# Altium footprint library L3.PcbLib: 47 footprints (part 1 of 3)
Each footprint in its own frame and in the unit in brackets; x right, y up, seen from the top. Pads: shape width x height; smd on the part's side, far side on the other; paste and mask are expansions set on the pad; w line width, h text height; cw(c..) or ccw(c..) is an arc to the next point about the centre after c.
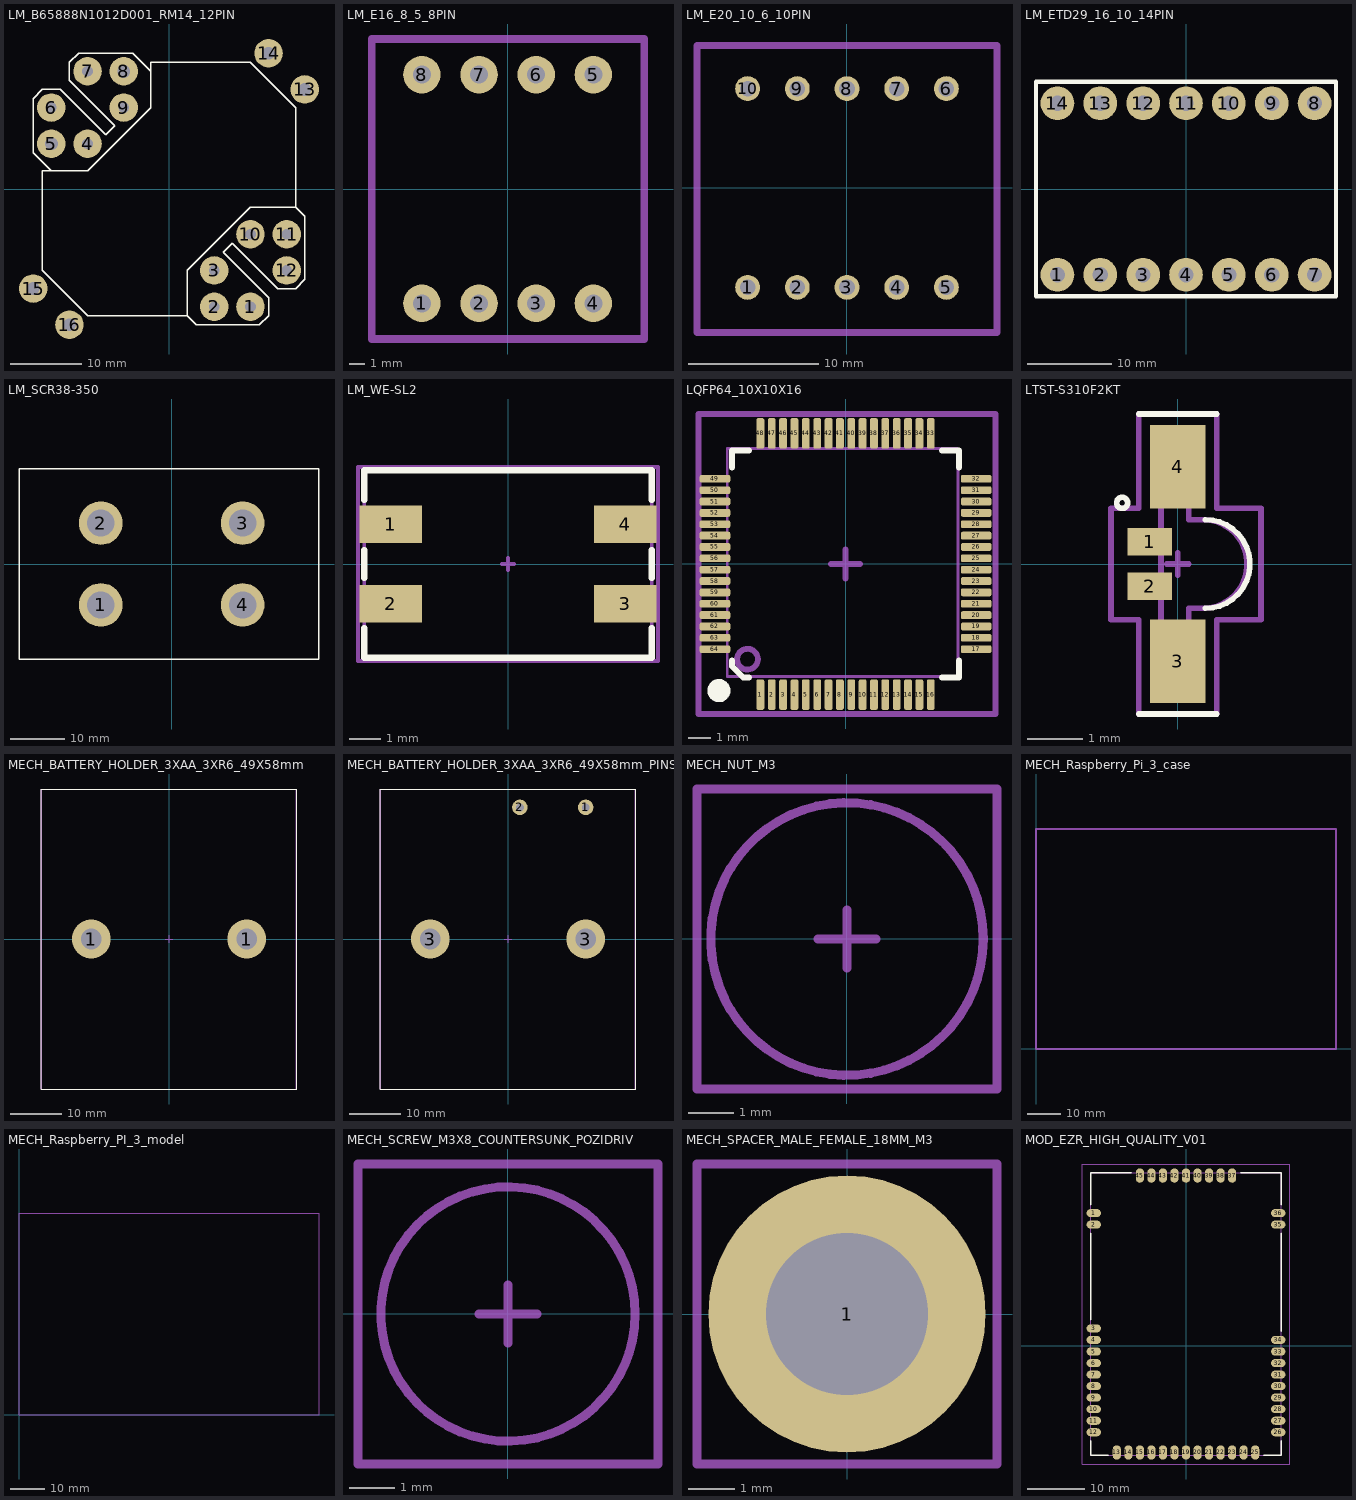
[diagram p0: the footprints below, top view; thin cyan lines are the x and y axes]

## LM_B65888N1012D001_RM14_12PIN [mm]
pads (16):
  round 4 hole 1.5: 1(11.43,-16.51) 2(6.35,-16.51) 3(6.35,-11.43) 4(-11.43,6.35) 6(-16.51,11.43) 7(-11.43,16.51) 9(-6.35,11.43) 10(11.43,-6.35) 11(16.51,-6.35) 12(16.51,-11.43)
  round 4 hole 1.8: 5(-16.51,6.35) 8(-6.35,16.51) 13(19.05,13.97) 14(13.97,19.05) 15(-19.05,-13.97) 16(-13.97,-19.05)
Top Overlay:
  lines w0.2: -16.51,2.54 -19.05,5.08 -19.05,10.16 -19.05,12.7 -17.78,13.97 -15.24,13.97 -10.16,8.89 -8.89,7.62 -7.62,8.89 -13.97,15.24 -13.97,17.78 -12.7,19.05 -10.16,19.05 -5.08,19.05 -2.54,16.51 ; 2.54,-17.78 3.81,-19.05 11.43,-19.05 12.7,-19.05 13.97,-17.78 13.97,-15.24 7.62,-8.89 8.89,-7.62 15.24,-13.97 17.78,-13.97 19.05,-12.7 19.05,-3.81 17.78,-2.54 ; 2.54,-17.78 2.54,-11.43 11.43,-2.54 17.78,-2.54 ; 2.54,-17.78 -11.43,-17.78 -17.78,-11.43 -17.78,2.54 -11.43,2.54 -2.54,11.43 -2.54,17.78 11.43,17.78 17.78,11.43 17.78,-2.54
3D body "RM-14_12pin.stp": height 30.25, standoff -2.75, extent -19.586,-19.586 19.586,19.586

## LM_E16_8_5_8PIN [mm]
pads (8):
  round 2.5 hole 1.2: 1(-5.715,-7.62) 2(-1.905,-7.62) 3(1.905,-7.62) 4(5.715,-7.62) 5(5.715,7.62) 6(1.905,7.62) 7(-1.905,7.62) 8(-5.715,7.62)
Mechanical 1:
  lines w0.508: -9.056,-10 9.106,-10 9.106,10 -9.056,10 -9.056,-10
3D body "User Library-Ensamblaje trafo 16-8-5.STEP": height 13.89, standoff -2.81, extent -9.056,-10 9.106,10

## LM_E20_10_6_10PIN [mm]
pads (10):
  round 1.905 hole 1.2: 1(-7.62,-7.62) 2(-3.81,-7.62) 3(0,-7.62) 4(3.81,-7.62) 5(7.62,-7.62) 6(7.62,7.62) 7(3.81,7.62) 8(0,7.62) 9(-3.81,7.62) 10(-7.62,7.62)
Mechanical 1:
  lines w0.508: -11.5,-11.078 11.5,-11.078 11.5,10.922 -11.5,10.922 -11.5,-11.078
3D body "e20.STEP": height 17.53, standoff -3.51, extent -11.5,-11.078 11.5,10.922

## LM_ETD29_16_10_14PIN [mm]
pads (14):
  round 4 hole 1.8: 1(-15.24,-10.16) 2(-10.16,-10.16) 3(-5.08,-10.16) 4(0,-10.16) 5(5.08,-10.16) 6(10.16,-10.16) 7(15.24,-10.16) 8(15.24,10.16) 9(10.16,10.16) 10(5.08,10.16) 11(0,10.16) 12(-5.08,10.16) 13(-10.16,10.16) 14(-15.24,10.16)
Top Overlay:
  lines w0.508: -17.78,-12.7 17.78,-12.7 17.78,12.7 -17.78,12.7 -17.78,-12.7
3D body "ETD29-K-V-14P.STEP": height 36.4, standoff -6.8, extent -17.5,-11.773 17.5,12.027

## LM_SCR38-350 [mm]
pads (4):
  round 8 hole 5: 1(-13,-7.5) 2(-13,7.5) 3(13,7.5) 4(13,-7.5)
Top Overlay:
  lines w0.254: -28,-17.5 27,-17.5 27,17.5 -28,17.5 -28,-17.5
3D body "choke_4pin.stp": height 52.25, standoff -3.92, extent -25.224,-21.584 25.017,21.166

## LM_WE-SL2 [mm] "SMD Inductor, 4-Leads, Body 9.2x6.0mm"
height 5
pads (4):
  rect 2x1.2 smd: 1(-3.75,1.27) 2(-3.75,-1.27) 3(3.75,-1.27) 4(3.75,1.27)
Top Overlay:
  lines w0.2: -4.6,-2.05 -4.6,-3 4.6,-3 4.6,-2.05 ; -4.6,-0.45 -4.6,0.45 ; -4.6,2.05 -4.6,3 4.6,3 4.6,2.05 ; 4.6,-0.45 4.6,0.45
Mechanical 13:
  lines w0.1: -4.6,-3 4.6,-3 4.6,3 -4.6,3 -4.6,-3
Mechanical 15:
  lines w0.127: -0.2,0 0.2,0 ; 0,-0.2 0,0.2 ; -4.8,-3.1 4.8,-3.1 4.8,3.1 -4.8,3.1 -4.8,-3.1
Mechanical 17:
  text "'.Designator'" at -4.8,-2.7 h0.51
Mechanical 19:
  text "'.Comment'" at -4.8,-2.7 h0.51
3D body "74422x.stp": height 5.05, standoff 0.05, extent -4.6,-3 4.6,3

## LQFP64_10X10X16 [mm]
pads (64):
  rrect50% 0.343x1.35 smd: 1(-3.75,-5.75) 2(-3.25,-5.75) 3(-2.75,-5.75) 4(-2.25,-5.75) 5(-1.75,-5.75) 6(-1.25,-5.75) 7(-0.75,-5.75) 8(-0.25,-5.75) 9(0.25,-5.75) 10(0.75,-5.75) 11(1.25,-5.75) 12(1.75,-5.75) 13(2.25,-5.75) 14(2.75,-5.75) 15(3.25,-5.75) 16(3.75,-5.75) 33(3.75,5.75) 34(3.25,5.75) 35(2.75,5.75) 36(2.25,5.75) 37(1.75,5.75) 38(1.25,5.75) 39(0.75,5.75) 40(0.25,5.75) 41(-0.25,5.75) 42(-0.75,5.75) 43(-1.25,5.75) 44(-1.75,5.75) 45(-2.25,5.75) 46(-2.75,5.75) 47(-3.25,5.75) 48(-3.75,5.75)
  rrect50% 1.35x0.343 smd: 17(5.75,-3.75) 18(5.75,-3.25) 19(5.75,-2.75) 20(5.75,-2.25) 21(5.75,-1.75) 22(5.75,-1.25) 23(5.75,-0.75) 24(5.75,-0.25) 25(5.75,0.25) 26(5.75,0.75) 27(5.75,1.25) 28(5.75,1.75) 29(5.75,2.25) 30(5.75,2.75) 31(5.75,3.25) 32(5.75,3.75) 49(-5.75,3.75) 50(-5.75,3.25) 51(-5.75,2.75) 52(-5.75,2.25) 53(-5.75,1.75) 54(-5.75,1.25) 55(-5.75,0.75) 56(-5.75,0.25) 57(-5.75,-0.25) 58(-5.75,-0.75) 59(-5.75,-1.25) 60(-5.75,-1.75) 61(-5.75,-2.25) 62(-5.75,-2.75) 63(-5.75,-3.25) 64(-5.75,-3.75)
Top Overlay:
  circle w0.508: c-5.575,-5.575 r0.254
  lines w0.254: -5,-4.25 -5,-4.5 -4.5,-5 -4.25,-5 ; -5,4.25 -5,5 -4.25,5 ; 4.25,-5 5,-5 5,-4.25 ; 4.25,5 5,5 5,4.25
Mechanical 2:
  circle w0.254: c-4.318,-4.191 r0.458
  lines w0.127: -5.207,-4.953 -5.207,5.08 -5.08,5.08 4.953,5.08 4.953,-4.953 -5.207,-4.953
Mechanical 4:
  lines w0.254: -0.635,0 0.635,0 ; 0,-0.635 0,0.635 ; -6.477,-6.604 -6.477,6.604 6.604,6.604 6.604,-6.604 -6.477,-6.604
3D body "User Library-LQFP64-1.step": height 1.56, standoff 0, extent -5.98,-6.02 6.02,5.98

## LTST-S310F2KT [mm]
pads (4):
  rect 0.8x0.5 smd: 1(-0.5,0.4) 2(-0.5,-0.4)
  rect 1x1.5 smd: 3(0,-1.75) 4(0,1.75)
Top Overlay:
  circle w0.1: c-1,1.1 r0.1
  lines w0.1: -0.7,-2.7 0.7,-2.7 ; -0.7,2.7 0.7,2.7 ; 0.5,-0.8 ccw(c0.5,0) 0.5,0.8
Mechanical 13:
  lines w0.1: -0.3,-1.8 -0.3,1.8 0.2,1.8 0.2,0.8 0.45,0.8 cw(c0.45,0) 0.45,-0.8 0.2,-0.8 0.2,-1.8 -0.3,-1.8
Mechanical 15:
  lines w0.1: -0.2,0 0.2,0 ; 0,-0.2 0,0.2 ; -1.2,-1 -1.2,1 -0.7,1 -0.7,2.7 0.7,2.7 0.7,1 1.5,1 1.5,-1 0.7,-1 0.7,-2.7 -0.7,-2.7 -0.7,-1 -1.2,-1
Mechanical 17:
  text "'.Designator'" at -0.2,2.9 h0.5
Mechanical 19:
  text "'.Comment'" at -0.2,1.9 h0.5
3D body: height 1, standoff 0.1, extent -0.3,-1.8 1.2,1.8

## MECH_BATTERY_HOLDER_3XAA_3XR6_49X58mm [mm]
pads (2):
  round 7.5 hole 4: 1(-15,0) 1(15,0)
Top Overlay:
  lines w0.2: -24.638,-28.956 24.638,-28.956 24.638,28.956 -24.638,28.956 -24.638,-28.956
Mechanical 13:
  lines w0.1: -24.6,-28.956 -24.6,28.956 24.6,28.956 24.6,-28.956 -24.6,-28.956
Mechanical 15:
  lines w0.1: -24.638,-28.956 -24.638,28.956 24.638,28.956 24.638,-28.956 -24.638,-28.956
  lines w0.2: -0.762,0 0.762,0 ; 0,-0.762 0,0.762
Mechanical 17:
  text ".Designator" at -6.35,-0.762 h1.52
Mechanical 19:
  text ".Comment" at -6.35,-0.762 h1.52
3D body "User Library-3aa battery holder.step": height 16.51, standoff 0, extent -24.646,-28.829 24.63,28.829

## MECH_BATTERY_HOLDER_3XAA_3XR6_49X58mm_PINS [mm]
pads (4):
  round 3 hole 1.5: 1(15,25.4) 2(2.3,25.4)
  round 7.5 hole 4: 3(-15,0) 3(15,0)
Top Overlay:
  lines w0.2: -24.638,-28.956 -24.638,28.956 24.638,28.956 24.638,-28.956 -24.638,-28.956
Mechanical 13:
  lines w0.1: -24.6,-28.956 24.6,-28.956 24.6,28.956 -24.6,28.956 -24.6,-28.956
Mechanical 15:
  lines w0.1: -24.638,-28.956 24.638,-28.956 24.638,28.956 -24.638,28.956 -24.638,-28.956
  lines w0.2: -0.762,0 0.762,0 ; 0,-0.762 0,0.762
Mechanical 17:
  text ".Designator" at -6.35,-0.762 h1.52
Mechanical 19:
  text ".Comment" at -6.35,-0.762 h1.52
3D body "User Library-3aa battery holder.step": height 16.59, standoff 0.08, extent -24.646,-28.829 24.63,28.829

## MECH_NUT_M3 [mm]
Mechanical 13:
  circle w0.2: c0,0 r3
Mechanical 15:
  lines w0.2: -0.635,0 0.635,0 ; 0,-0.635 0,0.635 ; -3.302,-3.302 -3.302,3.302 3.302,3.302 3.302,-3.302 -3.302,-3.302
Mechanical 17:
  text ".Designator" at -2.54,-0.381 h1.02
3D body "Hexagon nut ISO 4032 (DIN 934) - M3.STEP": height 2.42, standoff 0.02, extent -3.175,-2.75 3.176,2.75

## MECH_Raspberry_Pi_3_case [mm]
Mechanical 13:
  lines w0.508: 0,0 88.9,0 88.9,65.176 0,65.176 0,0
3D body "RPI3_case_3d_model-0-en.STEP": height 32, standoff 0, extent 0,0 88.9,65.2

## MECH_Raspberry_PI_3_model [mm]
Mechanical 13:
  lines w0.127: 0,0 87,0 87,58.35 0,58.35 0,0
3D body "RASPBERRY PI 3.STEP": height 16.2, standoff -1.3, extent 0,0 87,58.35

## MECH_SCREW_M3X8_COUNTERSUNK_POZIDRIV [mm]
Mechanical 13:
  circle w0.2: c0,0 r2.8
Mechanical 15:
  lines w0.2: -0.635,0 0.635,0 ; 0,-0.635 0,0.635 ; -3.302,-3.302 -3.302,3.302 3.302,3.302 3.302,-3.302 -3.302,-3.302
Mechanical 17:
  text ".Designator" at -2.54,-0.381 h1.02
3D body "User Library-DIN EN ISO 7046-1.step": height 3.05, standoff -4.95, extent -2.75,-2.746 2.75,2.746

## MECH_SPACER_MALE_FEMALE_18MM_M3 [mm]
pads (1):
  round 6 hole 3.5: 1(0,0)
Mechanical 15:
  lines w0.2: -0.5,0 0.5,0 ; 0,-0.5 0,0.5 ; -3.25,-3.25 3.25,-3.25 3.25,3.25 -3.25,3.25 -3.25,-3.25
Mechanical 17:
  text ".Designator" at -2.5,-0.5 h1.27
Mechanical 19:
  text "'.Comment'" at -3.341,-0.5 h1.27
3D body "Hex Spacer MF M3 L18mm.stp": height 18, standoff -6, extent -2.5,-2.887 2.5,2.887

## MOD_EZR_HIGH_QUALITY_V01 [mm]
pads (45):
  oval 2.5x1.4 smd: 1(-16,23) 2(-16,21) 3(-16,3) 4(-16,1) 5(-16,-1) 6(-16,-3) 7(-16,-5) 8(-16,-7) 9(-16,-9) 10(-16,-11) 11(-16,-13) 12(-16,-15) 26(16,-15) 27(16,-13) 28(16,-11) 29(16,-9) 30(16,-7) 31(16,-5) 32(16,-3) 33(16,-1) 34(16,1) 35(16,21) 36(16,23)
  oval 1.4x2.5 smd: 13(-12,-18.5) 14(-10,-18.5) 15(-8,-18.5) 16(-6,-18.5) 17(-4,-18.5) 18(-2,-18.5) 19(0,-18.5) 20(2,-18.5) 21(4,-18.5) 22(6,-18.5) 23(8,-18.5) 24(10,-18.5) 25(12,-18.5) 37(8,29.5) 38(6,29.5) 39(4,29.5) 40(2,29.5) 41(0,29.5) 42(-2,29.5) 43(-4,29.5) 44(-6,29.5) 45(-8,29.5)
Top Overlay:
  lines w0.305: -16.5,-16.5 -16.5,-19 -13.5,-19 ; -16.5,4.5 -16.5,19.5 ; -16.5,24.5 -16.5,30 -9.5,30 ; 9.5,30 16.5,30 16.5,24.5 ; 13.5,-19 16.5,-19 16.5,-16.5 ; 16.5,2.5 16.5,19.5
Mechanical 13:
  lines w0.2: -16.5,-19 16.5,-19 16.5,30 -16.5,30 -16.5,-19
Mechanical 15:
  lines w0.1: -18,-20.5 -18,31.5 18,31.5 18,-20.5 -18,-20.5
Mechanical 17:
  text "'.Designator'" at -14,2 h2.5
Mechanical 19:
  text "'.Comment'" at -11,2 h2.5
3D body "zamel_HQ_5_5mm.step": height 7.16, standoff 0.07, extent -16.5,-19 16.5,30